# Altium schematic symbol library Molex FFC - FPC Connectors (SMT).SchLib: 638 symbols (part 8 of 10)
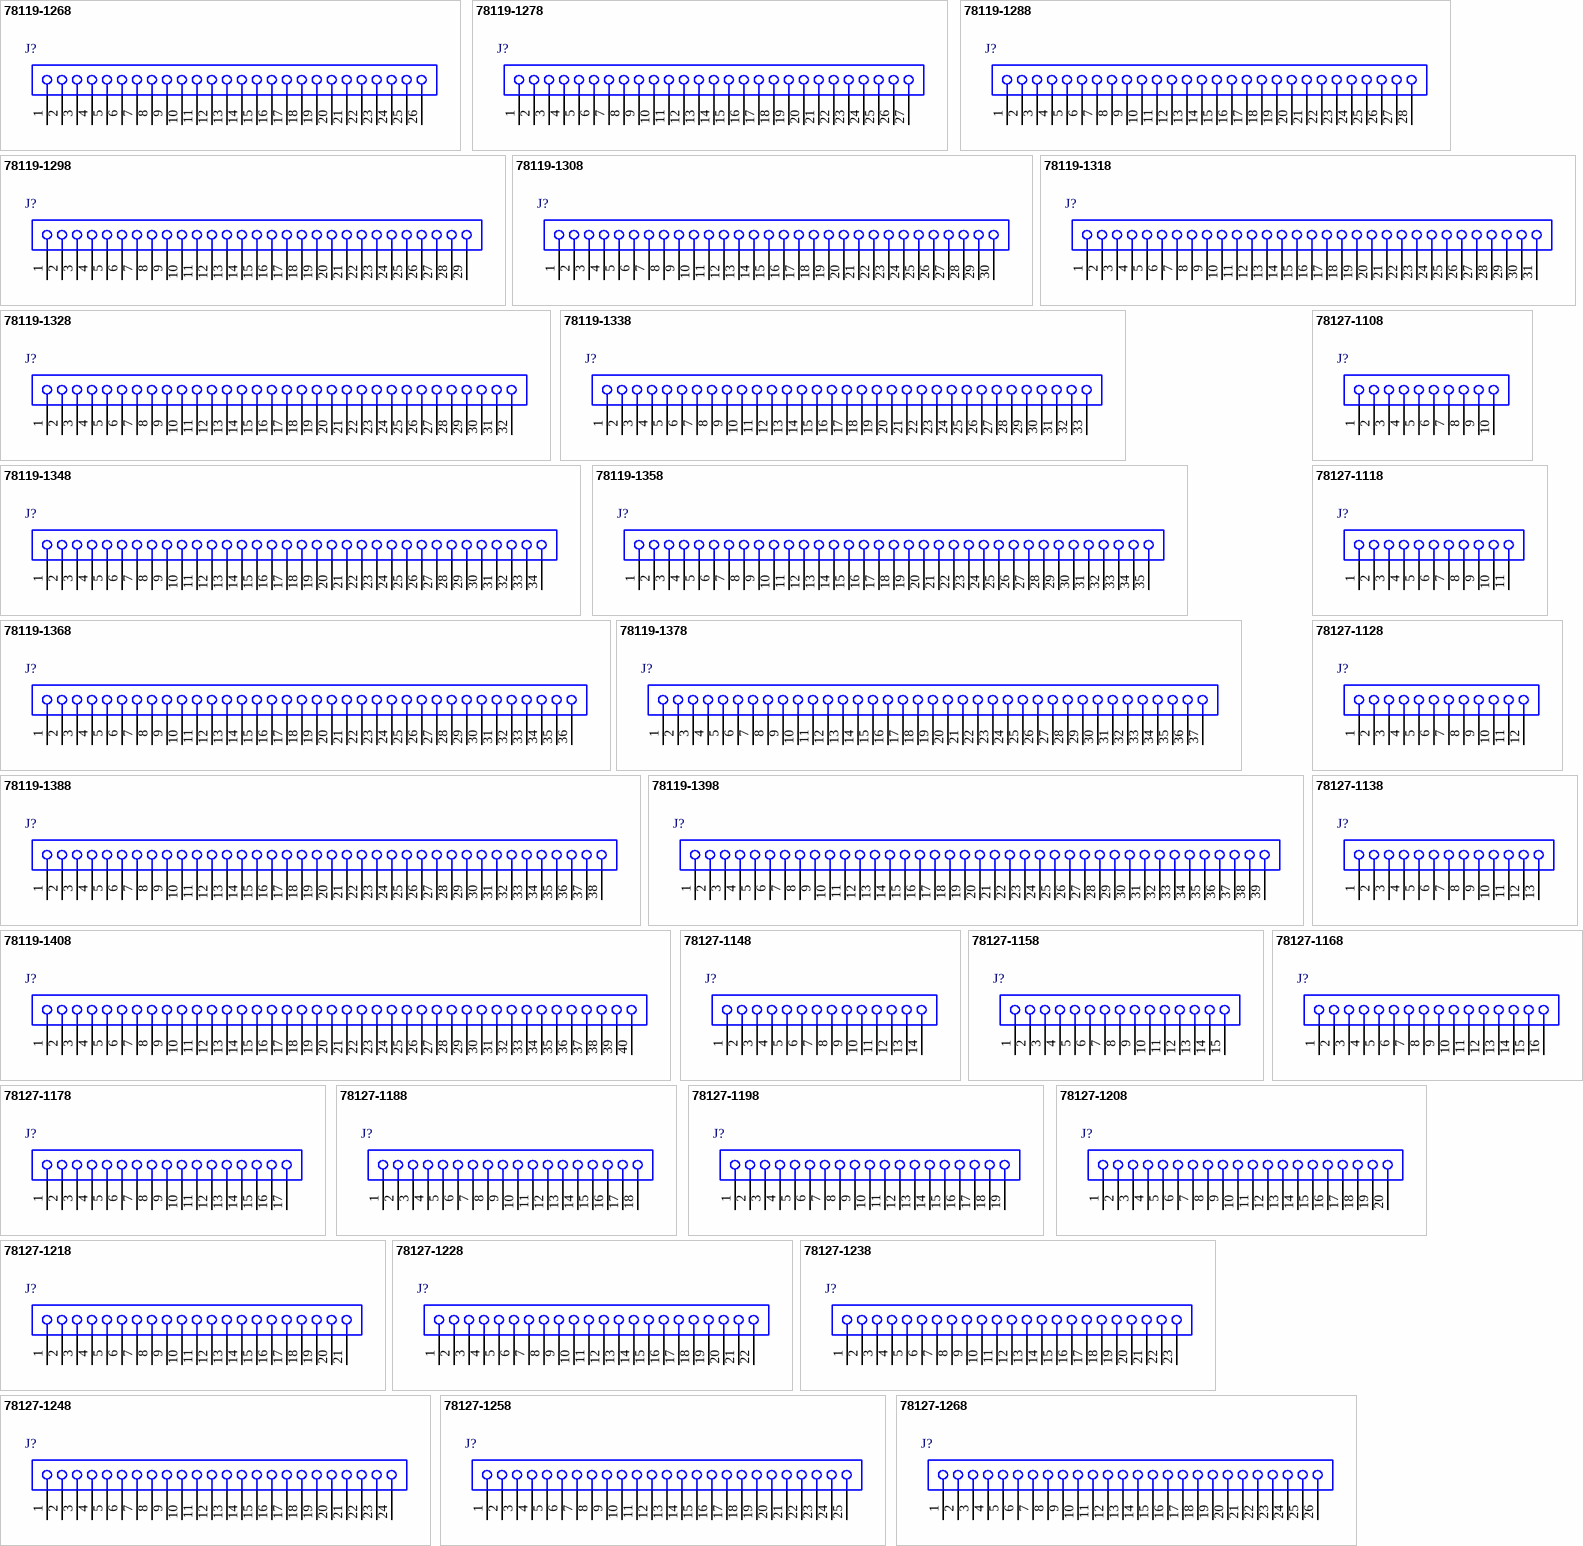
[diagram p28: symbols 78119-1268 to 78127-1268]

## 78119-1378
designator J?
0.5 mm Pitch Easy-On(TM) Type FPC Connector, 4.1 mm Mated Height, Vertical, Non-ZIF, SMT, 37 Circuits, -40 to 85 degC, ELV and RoHS Compliant, Tape and Reel; Manufacturer: Molex; PartNumber: 78119-1378; Circuits (Loaded): 37; Current (Max per Contact): 0.5A; Durability (mating cycles max): 20; Mated Height: 4.10mm; Material - Metal: Copper Alloy; Material - Plating Mating: Gold, Nickel; PCB Locator: No; PCB Retention: None; Pitch - Mating Interface: 0.50mm; Voltage (Max): 50V AC; PackageVersion: Rev. A4, 06/2013; PackageReference: 78119-1378; PackageDescription: 37-Lead FPC Connector, Pitch 0.5 mm; Contact Position: N/A; Entry Angle: Vertical; Number of Rows: 1; Orientation: Vertical; Packing: Tape and Reel; Pitch - Termination Interface: 0.50mm; Polarized to PCB: No; RoHS: TRUE; Stackable: No; Mounting Technology: Surface Mount; ComponentLink1Description: Manufacturer URL; ComponentLink1URL: http://www.molex.com/molex/index.jsp; ComponentLink2Description: Datasheet; ComponentLink2URL: http://www.molex.com/webdocs/datasheets/pdf/en-us/0781191378_FFC_FPC_CONNECTORS.pdf; ComponentLink3Description: Package Specification; ComponentLink3URL: http://www.molex.com/pdm_docs/sd/781191378_sd.pdf
footprint MOLX-78119-1378 (FPC Connector, 37-Leads, Vertical, Pitch 0.5 mm, Mated Height 4.1 mm, SMT)
pins: 1, 2, 3, 4, 5, 6, 7, 8, 9, 10, 11, 12, 13, 14, 15, 16, 17, 18, 19, 20, 21, 22, 23, 24, 25, 26, 27, 28, 29, 30, 31, 32, 33, 34, 35, 36, 37

## 78119-1388
designator J?
0.5 mm Pitch Easy-On(TM) Type FPC Connector, 4.1 mm Mated Height, Vertical, Non-ZIF, SMT, 38 Circuits, -40 to 85 degC, ELV and RoHS Compliant, Tape and Reel; Manufacturer: Molex; PartNumber: 78119-1388; Circuits (Loaded): 38; Current (Max per Contact): 0.5A; Durability (mating cycles max): 20; Mated Height: 4.10mm; Material - Metal: Copper Alloy; Material - Plating Mating: Gold, Nickel; PCB Locator: No; PCB Retention: None; Pitch - Mating Interface: 0.50mm; Voltage (Max): 50V AC; PackageVersion: Rev. A4, 06/2013; PackageReference: 78119-1388; PackageDescription: 38-Lead FPC Connector, Pitch 0.5 mm; Contact Position: N/A; Entry Angle: Vertical; Number of Rows: 1; Orientation: Vertical; Packing: Tape and Reel; Pitch - Termination Interface: 0.50mm; Polarized to PCB: No; RoHS: TRUE; Stackable: No; Mounting Technology: Surface Mount; ComponentLink1Description: Manufacturer URL; ComponentLink1URL: http://www.molex.com/molex/index.jsp; ComponentLink2Description: Datasheet; ComponentLink2URL: http://www.molex.com/webdocs/datasheets/pdf/en-us/0781191388_FFC_FPC_CONNECTORS.pdf; ComponentLink3Description: Package Specification; ComponentLink3URL: http://www.molex.com/pdm_docs/sd/781191388_sd.pdf
footprint MOLX-78119-1388 (FPC Connector, 38-Leads, Vertical, Pitch 0.5 mm, Mated Height 4.1 mm, SMT)
pins: 1, 2, 3, 4, 5, 6, 7, 8, 9, 10, 11, 12, 13, 14, 15, 16, 17, 18, 19, 20, 21, 22, 23, 24, 25, 26, 27, 28, 29, 30, 31, 32, 33, 34, 35, 36, 37, 38

## 78119-1398
designator J?
0.5 mm Pitch Easy-On(TM) Type FPC Connector, 4.1 mm Mated Height, Vertical, Non-ZIF, SMT, 39 Circuits, -40 to 85 degC, ELV and RoHS Compliant, Tape and Reel; Manufacturer: Molex; PartNumber: 78119-1398; Circuits (Loaded): 39; Current (Max per Contact): 0.5A; Durability (mating cycles max): 20; Mated Height: 4.10mm; Material - Metal: Copper Alloy; Material - Plating Mating: Gold, Nickel; PCB Locator: No; PCB Retention: None; Pitch - Mating Interface: 0.50mm; Voltage (Max): 50V AC; PackageVersion: Rev. A4, 06/2013; PackageReference: 78119-1398; PackageDescription: 39-Lead FPC Connector, Pitch 0.5 mm; Contact Position: N/A; Entry Angle: Vertical; Number of Rows: 1; Orientation: Vertical; Packing: Tape and Reel; Pitch - Termination Interface: 0.50mm; Polarized to PCB: No; RoHS: TRUE; Stackable: No; Mounting Technology: Surface Mount; ComponentLink1Description: Manufacturer URL; ComponentLink1URL: http://www.molex.com/molex/index.jsp; ComponentLink2Description: Datasheet; ComponentLink2URL: http://www.molex.com/webdocs/datasheets/pdf/en-us/0781191398_FFC_FPC_CONNECTORS.pdf; ComponentLink3Description: Package Specification; ComponentLink3URL: http://www.molex.com/pdm_docs/sd/781191398_sd.pdf
footprint MOLX-78119-1398 (FPC Connector, 39-Leads, Vertical, Pitch 0.5 mm, Mated Height 4.1 mm, SMT)
pins: 1, 2, 3, 4, 5, 6, 7, 8, 9, 10, 11, 12, 13, 14, 15, 16, 17, 18, 19, 20, 21, 22, 23, 24, 25, 26, 27, 28, 29, 30, 31, 32, 33, 34, 35, 36, 37, 38, 39

## 78119-1408
designator J?
0.5 mm Pitch Easy-On(TM) Type FPC Connector, 4.1 mm Mated Height, Vertical, Non-ZIF, SMT, 40 Circuits, -40 to 85 degC, ELV and RoHS Compliant, Tape and Reel; Manufacturer: Molex; PartNumber: 78119-1408; Circuits (Loaded): 40; Current (Max per Contact): 0.5A; Durability (mating cycles max): 20; Mated Height: 4.10mm; Material - Metal: Copper Alloy; Material - Plating Mating: Gold, Nickel; PCB Locator: No; PCB Retention: None; Pitch - Mating Interface: 0.50mm; Voltage (Max): 50V AC; PackageVersion: Rev. A4, 06/2013; PackageReference: 78119-1408; PackageDescription: 40-Lead FPC Connector, Pitch 0.5 mm; Contact Position: N/A; Entry Angle: Vertical; Number of Rows: 1; Orientation: Vertical; Packing: Tape and Reel; Pitch - Termination Interface: 0.50mm; Polarized to PCB: No; RoHS: TRUE; Stackable: No; Mounting Technology: Surface Mount; ComponentLink1Description: Manufacturer URL; ComponentLink1URL: http://www.molex.com/molex/index.jsp; ComponentLink2Description: Datasheet; ComponentLink2URL: http://www.molex.com/webdocs/datasheets/pdf/en-us/0781191408_FFC_FPC_CONNECTORS.pdf; ComponentLink3Description: Package Specification; ComponentLink3URL: http://www.molex.com/pdm_docs/sd/781191408_sd.pdf
footprint MOLX-78119-1408 (FPC Connector, 40-Leads, Vertical, Pitch 0.5 mm, Mated Height 4.1 mm, SMT)
pins: 1, 2, 3, 4, 5, 6, 7, 8, 9, 10, 11, 12, 13, 14, 15, 16, 17, 18, 19, 20, 21, 22, 23, 24, 25, 26, 27, 28, 29, 30, 31, 32, 33, 34, 35, 36, 37, 38, 39, 40

## 78127-1108
designator J?
0.5 mm Pitch Easy-On(TM) Type FPC Connector, 4.1 mm Mated Height, Vertical, Non-ZIF, SMT, 10 Circuits, -40 to 85 degC, ELV and RoHS Compliant, Tape and Reel; Manufacturer: Molex; PartNumber: 78127-1108; Circuits (Loaded): 10; Current (Max per Contact): 0.5A; Durability (mating cycles max): 20; Mated Height: 4.10mm; Material - Metal: Copper Alloy; Material - Plating Mating: Gold, Nickel; PCB Locator: No; PCB Retention: None; Pitch - Mating Interface: 0.50mm; Voltage (Max): 50V AC; PackageVersion: Rev. B, 12/2012; PackageReference: 78127-1108; PackageDescription: 10-Lead FPC Connector, Pitch 0.5 mm; Circuits (maximum): 10; Contact Position: N/A; Entry Angle: Vertical; Number of Rows: 1; Orientation: Vertical; Packing: Tape and Reel; Pitch - Termination Interface: 0.50mm; Polarized to PCB: No; RoHS: TRUE; Stackable: No; Mounting Technology: Surface Mount; ComponentLink1Description: Manufacturer URL; ComponentLink1URL: http://www.molex.com/molex/index.jsp; ComponentLink2Description: Datasheet; ComponentLink2URL: http://www.molex.com/webdocs/datasheets/pdf/en-us/0781271108_FFC_FPC_CONNECTORS.pdf; ComponentLink3Description: Package Specification; ComponentLink3URL: http://www.molex.com/pdm_docs/sd/781271108_sd.pdf
footprint MOLX-78127-1108 (FPC Connector, 10-Leads, Vertical, Pitch 0.5 mm, Mated Height 4.1 mm, SMT)
pins: 1, 2, 3, 4, 5, 6, 7, 8, 9, 10

## 78127-1118
designator J?
0.5 mm Pitch Easy-On(TM) Type FPC Connector, 4.1 mm Mated Height, Vertical, Non-ZIF, SMT, 11 Circuits, -40 to 85 degC, ELV and RoHS Compliant, Tape and Reel; Manufacturer: Molex; PartNumber: 78127-1118; Circuits (Loaded): 11; Current (Max per Contact): 0.5A; Durability (mating cycles max): 20; Mated Height: 4.10mm; Material - Metal: Copper Alloy; Material - Plating Mating: Gold, Nickel; PCB Locator: No; PCB Retention: None; Pitch - Mating Interface: 0.50mm; Voltage (Max): 50V AC; PackageVersion: Rev. B, 12/2012; PackageReference: 78127-1118; PackageDescription: 11-Lead FPC Connector, Pitch 0.5 mm; Circuits (maximum): 11; Contact Position: N/A; Entry Angle: Vertical; Number of Rows: 1; Orientation: Vertical; Packing: Tape and Reel; Pitch - Termination Interface: 0.50mm; Polarized to PCB: No; RoHS: TRUE; Stackable: No; Mounting Technology: Surface Mount; ComponentLink1Description: Manufacturer URL; ComponentLink1URL: http://www.molex.com/molex/index.jsp; ComponentLink2Description: Datasheet; ComponentLink2URL: http://www.molex.com/webdocs/datasheets/pdf/en-us/0781271118_FFC_FPC_CONNECTORS.pdf; ComponentLink3Description: Package Specification; ComponentLink3URL: http://www.molex.com/pdm_docs/sd/781271118_sd.pdf
footprint MOLX-78127-1118 (FPC Connector, 11-Leads, Vertical, Pitch 0.5 mm, Mated Height 4.1 mm, SMT)
pins: 1, 2, 3, 4, 5, 6, 7, 8, 9, 10, 11

## 78127-1128
designator J?
0.5 mm Pitch Easy-On(TM) Type FPC Connector, 4.1 mm Mated Height, Vertical, Non-ZIF, SMT, 12 Circuits, -40 to 85 degC, ELV and RoHS Compliant, Tape and Reel; Manufacturer: Molex; PartNumber: 78127-1128; Circuits (Loaded): 12; Current (Max per Contact): 0.5A; Durability (mating cycles max): 20; Mated Height: 4.10mm; Material - Metal: Copper Alloy; Material - Plating Mating: Gold, Nickel; PCB Locator: No; PCB Retention: None; Pitch - Mating Interface: 0.50mm; Voltage (Max): 50V AC; PackageVersion: Rev. B, 12/2012; PackageReference: 78127-1128; PackageDescription: 12-Lead FPC Connector, Pitch 0.5 mm; Circuits (maximum): 12; Contact Position: N/A; Entry Angle: Vertical; Number of Rows: 1; Orientation: Vertical; Packing: Tape and Reel; Pitch - Termination Interface: 0.50mm; Polarized to PCB: No; RoHS: TRUE; Stackable: No; Mounting Technology: Surface Mount; ComponentLink1Description: Manufacturer URL; ComponentLink1URL: http://www.molex.com/molex/index.jsp; ComponentLink2Description: Datasheet; ComponentLink2URL: http://www.molex.com/webdocs/datasheets/pdf/en-us/0781271128_FFC_FPC_CONNECTORS.pdf; ComponentLink3Description: Package Specification; ComponentLink3URL: http://www.molex.com/pdm_docs/sd/781271128_sd.pdf
footprint MOLX-78127-1128 (FPC Connector, 12-Leads, Vertical, Pitch 0.5 mm, Mated Height 4.1 mm, SMT)
pins: 1, 2, 3, 4, 5, 6, 7, 8, 9, 10, 11, 12

## 78127-1138
designator J?
0.5 mm Pitch Easy-On(TM) Type FPC Connector, 4.1 mm Mated Height, Vertical, Non-ZIF, SMT, 13 Circuits, -40 to 85 degC, ELV and RoHS Compliant, Tape and Reel; Manufacturer: Molex; PartNumber: 78127-1138; Circuits (Loaded): 13; Current (Max per Contact): 0.5A; Durability (mating cycles max): 20; Mated Height: 4.10mm; Material - Metal: Copper Alloy; Material - Plating Mating: Gold, Nickel; PCB Locator: No; PCB Retention: None; Pitch - Mating Interface: 0.50mm; Voltage (Max): 50V AC; PackageVersion: Rev. B, 12/2012; PackageReference: 78127-1138; PackageDescription: 13-Lead FPC Connector, Pitch 0.5 mm; Circuits (maximum): 13; Contact Position: N/A; Entry Angle: Vertical; Number of Rows: 1; Orientation: Vertical; Packing: Tape and Reel; Pitch - Termination Interface: 0.50mm; Polarized to PCB: No; RoHS: TRUE; Stackable: No; Mounting Technology: Surface Mount; ComponentLink1Description: Manufacturer URL; ComponentLink1URL: http://www.molex.com/molex/index.jsp; ComponentLink2Description: Datasheet; ComponentLink2URL: http://www.molex.com/webdocs/datasheets/pdf/en-us/0781271138_FFC_FPC_CONNECTORS.pdf; ComponentLink3Description: Package Specification; ComponentLink3URL: http://www.molex.com/pdm_docs/sd/781271138_sd.pdf
footprint MOLX-78127-1138 (FPC Connector, 13-Leads, Vertical, Pitch 0.5 mm, Mated Height 4.1 mm, SMT)
pins: 1, 2, 3, 4, 5, 6, 7, 8, 9, 10, 11, 12, 13

## 78127-1148
designator J?
0.5 mm Pitch Easy-On(TM) Type FPC Connector, 4.1 mm Mated Height, Vertical, Non-ZIF, SMT, 14 Circuits, -40 to 85 degC, ELV and RoHS Compliant, Tape and Reel; Manufacturer: Molex; PartNumber: 78127-1148; Circuits (Loaded): 14; Current (Max per Contact): 0.5A; Durability (mating cycles max): 20; Mated Height: 4.10mm; Material - Metal: Copper Alloy; Material - Plating Mating: Gold, Nickel; PCB Locator: No; PCB Retention: None; Pitch - Mating Interface: 0.50mm; Voltage (Max): 50V AC; PackageVersion: Rev. B, 12/2012; PackageReference: 78127-1148; PackageDescription: 14-Lead FPC Connector, Pitch 0.5 mm; Circuits (maximum): 14; Contact Position: N/A; Entry Angle: Vertical; Number of Rows: 1; Orientation: Vertical; Packing: Tape and Reel; Pitch - Termination Interface: 0.50mm; Polarized to PCB: No; RoHS: TRUE; Stackable: No; Mounting Technology: Surface Mount; ComponentLink1Description: Manufacturer URL; ComponentLink1URL: http://www.molex.com/molex/index.jsp; ComponentLink2Description: Datasheet; ComponentLink2URL: http://www.molex.com/webdocs/datasheets/pdf/en-us/0781271148_FFC_FPC_CONNECTORS.pdf; ComponentLink3Description: Package Specification; ComponentLink3URL: http://www.molex.com/pdm_docs/sd/781271148_sd.pdf
footprint MOLX-78127-1148 (FPC Connector, 14-Leads, Vertical, Pitch 0.5 mm, Mated Height 4.1 mm, SMT)
pins: 1, 2, 3, 4, 5, 6, 7, 8, 9, 10, 11, 12, 13, 14

## 78127-1158
designator J?
0.5 mm Pitch Easy-On(TM) Type FPC Connector, 4.1 mm Mated Height, Vertical, Non-ZIF, SMT, 15 Circuits, -40 to 85 degC, ELV and RoHS Compliant, Tape and Reel; Manufacturer: Molex; PartNumber: 78127-1158; Circuits (Loaded): 15; Current (Max per Contact): 0.5A; Durability (mating cycles max): 20; Mated Height: 4.10mm; Material - Metal: Copper Alloy; Material - Plating Mating: Gold, Nickel; PCB Locator: No; PCB Retention: None; Pitch - Mating Interface: 0.50mm; Voltage (Max): 50V AC; PackageVersion: Rev. B, 12/2012; PackageReference: 78127-1158; PackageDescription: 15-Lead FPC Connector, Pitch 0.5 mm; Circuits (maximum): 15; Contact Position: N/A; Entry Angle: Vertical; Number of Rows: 1; Orientation: Vertical; Packing: Tape and Reel; Pitch - Termination Interface: 0.50mm; Polarized to PCB: No; RoHS: TRUE; Stackable: No; Mounting Technology: Surface Mount; ComponentLink1Description: Manufacturer URL; ComponentLink1URL: http://www.molex.com/molex/index.jsp; ComponentLink2Description: Datasheet; ComponentLink2URL: http://www.molex.com/webdocs/datasheets/pdf/en-us/0781271158_FFC_FPC_CONNECTORS.pdf; ComponentLink3Description: Package Specification; ComponentLink3URL: http://www.molex.com/pdm_docs/sd/781271158_sd.pdf
footprint MOLX-78127-1158 (FPC Connector, 15-Leads, Vertical, Pitch 0.5 mm, Mated Height 4.1 mm, SMT)
pins: 1, 2, 3, 4, 5, 6, 7, 8, 9, 10, 11, 12, 13, 14, 15

## 78127-1168
designator J?
0.5 mm Pitch Easy-On(TM) Type FPC Connector, 4.1 mm Mated Height, Vertical, Non-ZIF, SMT, 16 Circuits, -40 to 85 degC, ELV and RoHS Compliant, Tape and Reel; Manufacturer: Molex; PartNumber: 78127-1168; Circuits (Loaded): 16; Current (Max per Contact): 0.5A; Durability (mating cycles max): 20; Mated Height: 4.10mm; Material - Metal: Copper Alloy; Material - Plating Mating: Gold, Nickel; PCB Locator: No; PCB Retention: None; Pitch - Mating Interface: 0.50mm; Voltage (Max): 50V AC; PackageVersion: Rev. B, 12/2012; PackageReference: 78127-1168; PackageDescription: 16-Lead FPC Connector, Pitch 0.5 mm; Circuits (maximum): 16; Contact Position: N/A; Entry Angle: Vertical; Number of Rows: 1; Orientation: Vertical; Packing: Tape and Reel; Pitch - Termination Interface: 0.50mm; Polarized to PCB: No; RoHS: TRUE; Stackable: No; Mounting Technology: Surface Mount; ComponentLink1Description: Manufacturer URL; ComponentLink1URL: http://www.molex.com/molex/index.jsp; ComponentLink2Description: Datasheet; ComponentLink2URL: http://www.molex.com/webdocs/datasheets/pdf/en-us/0781271168_FFC_FPC_CONNECTORS.pdf; ComponentLink3Description: Package Specification; ComponentLink3URL: http://www.molex.com/pdm_docs/sd/781271168_sd.pdf
footprint MOLX-78127-1168 (FPC Connector, 16-Leads, Vertical, Pitch 0.5 mm, Mated Height 4.1 mm, SMT)
pins: 1, 2, 3, 4, 5, 6, 7, 8, 9, 10, 11, 12, 13, 14, 15, 16

## 78127-1178
designator J?
0.5 mm Pitch Easy-On(TM) Type FPC Connector, 4.1 mm Mated Height, Vertical, Non-ZIF, SMT, 17 Circuits, -40 to 85 degC, ELV and RoHS Compliant, Tape and Reel; Manufacturer: Molex; PartNumber: 78127-1178; Circuits (Loaded): 17; Current (Max per Contact): 0.5A; Durability (mating cycles max): 20; Mated Height: 4.10mm; Material - Metal: Copper Alloy; Material - Plating Mating: Gold, Nickel; PCB Locator: No; PCB Retention: None; Pitch - Mating Interface: 0.50mm; Voltage (Max): 50V AC; PackageVersion: Rev. B, 12/2012; PackageReference: 78127-1178; PackageDescription: 17-Lead FPC Connector, Pitch 0.5 mm; Circuits (maximum): 17; Contact Position: N/A; Entry Angle: Vertical; Number of Rows: 1; Orientation: Vertical; Packing: Tape and Reel; Pitch - Termination Interface: 0.50mm; Polarized to PCB: No; RoHS: TRUE; Stackable: No; Mounting Technology: Surface Mount; ComponentLink1Description: Manufacturer URL; ComponentLink1URL: http://www.molex.com/molex/index.jsp; ComponentLink2Description: Datasheet; ComponentLink2URL: http://www.molex.com/webdocs/datasheets/pdf/en-us/0781271178_FFC_FPC_CONNECTORS.pdf; ComponentLink3Description: Package Specification; ComponentLink3URL: http://www.molex.com/pdm_docs/sd/781271178_sd.pdf
footprint MOLX-78127-1178 (FPC Connector, 17-Leads, Vertical, Pitch 0.5 mm, Mated Height 4.1 mm, SMT)
pins: 1, 2, 3, 4, 5, 6, 7, 8, 9, 10, 11, 12, 13, 14, 15, 16, 17

## 78127-1188
designator J?
0.5 mm Pitch Easy-On(TM) Type FPC Connector, 4.1 mm Mated Height, Vertical, Non-ZIF, SMT, 18 Circuits, -40 to 85 degC, ELV and RoHS Compliant, Tape and Reel; Manufacturer: Molex; PartNumber: 78127-1188; Circuits (Loaded): 18; Current (Max per Contact): 0.5A; Durability (mating cycles max): 20; Mated Height: 4.10mm; Material - Metal: Copper Alloy; Material - Plating Mating: Gold, Nickel; PCB Locator: No; PCB Retention: None; Pitch - Mating Interface: 0.50mm; Voltage (Max): 50V AC; PackageVersion: Rev. B, 12/2012; PackageReference: 78127-1188; PackageDescription: 18-Lead FPC Connector, Pitch 0.5 mm; Circuits (maximum): 18; Contact Position: N/A; Entry Angle: Vertical; Number of Rows: 1; Orientation: Vertical; Packing: Tape and Reel; Pitch - Termination Interface: 0.50mm; Polarized to PCB: No; RoHS: TRUE; Stackable: No; Mounting Technology: Surface Mount; ComponentLink1Description: Manufacturer URL; ComponentLink1URL: http://www.molex.com/molex/index.jsp; ComponentLink2Description: Datasheet; ComponentLink2URL: http://www.molex.com/webdocs/datasheets/pdf/en-us/0781271188_FFC_FPC_CONNECTORS.pdf; ComponentLink3Description: Package Specification; ComponentLink3URL: http://www.molex.com/pdm_docs/sd/781271188_sd.pdf
footprint MOLX-78127-1188 (FPC Connector, 18-Leads, Vertical, Pitch 0.5 mm, Mated Height 4.1 mm, SMT)
pins: 1, 2, 3, 4, 5, 6, 7, 8, 9, 10, 11, 12, 13, 14, 15, 16, 17, 18

## 78127-1198
designator J?
0.5 mm Pitch Easy-On(TM) Type FPC Connector, 4.1 mm Mated Height, Vertical, Non-ZIF, SMT, 19 Circuits, -40 to 85 degC, ELV and RoHS Compliant, Tape and Reel; Manufacturer: Molex; PartNumber: 78127-1198; Circuits (Loaded): 19; Current (Max per Contact): 0.5A; Durability (mating cycles max): 20; Mated Height: 4.10mm; Material - Metal: Copper Alloy; Material - Plating Mating: Gold, Nickel; PCB Locator: No; PCB Retention: None; Pitch - Mating Interface: 0.50mm; Voltage (Max): 50V AC; PackageVersion: Rev. B, 12/2012; PackageReference: 78127-1198; PackageDescription: 19-Lead FPC Connector, Pitch 0.5 mm; Circuits (maximum): 19; Contact Position: N/A; Entry Angle: Vertical; Number of Rows: 1; Orientation: Vertical; Packing: Tape and Reel; Pitch - Termination Interface: 0.50mm; Polarized to PCB: No; RoHS: TRUE; Stackable: No; Mounting Technology: Surface Mount; ComponentLink1Description: Manufacturer URL; ComponentLink1URL: http://www.molex.com/molex/index.jsp; ComponentLink2Description: Datasheet; ComponentLink2URL: http://www.molex.com/webdocs/datasheets/pdf/en-us/0781271198_FFC_FPC_CONNECTORS.pdf; ComponentLink3Description: Package Specification; ComponentLink3URL: http://www.molex.com/pdm_docs/sd/781271198_sd.pdf
footprint MOLX-78127-1198 (FPC Connector, 19-Leads, Vertical, Pitch 0.5 mm, Mated Height 4.1 mm, SMT)
pins: 1, 2, 3, 4, 5, 6, 7, 8, 9, 10, 11, 12, 13, 14, 15, 16, 17, 18, 19

## 78127-1208
designator J?
0.5 mm Pitch Easy-On(TM) Type FPC Connector, 4.1 mm Mated Height, Vertical, Non-ZIF, SMT, 20 Circuits, -40 to 85 degC, ELV and RoHS Compliant, Tape and Reel; Manufacturer: Molex; PartNumber: 78127-1208; Circuits (Loaded): 20; Current (Max per Contact): 0.5A; Mated Height: 4.10mm; Material - Metal: Copper Alloy; Material - Plating Mating: Gold, Nickel; PCB Locator: No; PCB Retention: None; Pitch - Mating Interface: 0.50mm; Voltage (Max): 50V AC; PackageVersion: Rev. B, 12/2012; PackageReference: 78127-1208; PackageDescription: 20-Lead FPC Connector, Pitch 0.5 mm; Circuits (maximum): 20; Contact Position: N/A; Durability (mating cycles max): 20; Entry Angle: Vertical; Number of Rows: 1; Orientation: Vertical; Packing: Tape and Reel; Pitch - Termination Interface: 0.50mm; Polarized to PCB: No; RoHS: TRUE; Stackable: No; Mounting Technology: Surface Mount; ComponentLink1Description: Manufacturer URL; ComponentLink1URL: http://www.molex.com/molex/index.jsp; ComponentLink2Description: Datasheet; ComponentLink2URL: http://www.molex.com/webdocs/datasheets/pdf/en-us/0781271208_FFC_FPC_CONNECTORS.pdf; ComponentLink3Description: Package Specification; ComponentLink3URL: http://www.molex.com/pdm_docs/sd/781271208_sd.pdf
footprint MOLX-78127-1208 (FPC Connector, 20-Leads, Vertical, Pitch 0.5 mm, Mated Height 4.1 mm, SMT)
pins: 1, 2, 3, 4, 5, 6, 7, 8, 9, 10, 11, 12, 13, 14, 15, 16, 17, 18, 19, 20

## 78127-1218
designator J?
0.5 mm Pitch Easy-On(TM) Type FPC Connector, 4.1 mm Mated Height, Vertical, Non-ZIF, SMT, 21 Circuits, -40 to 85 degC, ELV and RoHS Compliant, Tape and Reel; Manufacturer: Molex; PartNumber: 78127-1218; Circuits (Loaded): 21; Current (Max per Contact): 0.5A; Durability (mating cycles max): 20; Mated Height: 4.10mm; Material - Metal: Copper Alloy; Material - Plating Mating: Gold, Nickel; PCB Locator: No; PCB Retention: None; Pitch - Mating Interface: 0.50mm; Voltage (Max): 50V AC; PackageVersion: Rev. B, 12/2012; PackageReference: 78127-1218; PackageDescription: 21-Lead FPC Connector, Pitch 0.5 mm; Circuits (maximum): 21; Contact Position: N/A; Entry Angle: Vertical; Number of Rows: 1; Orientation: Vertical; Packing: Tape and Reel; Pitch - Termination Interface: 0.50mm; Polarized to PCB: No; RoHS: TRUE; Stackable: No; Mounting Technology: Surface Mount; ComponentLink1Description: Manufacturer URL; ComponentLink1URL: http://www.molex.com/molex/index.jsp; ComponentLink2Description: Datasheet; ComponentLink2URL: http://www.molex.com/webdocs/datasheets/pdf/en-us/0781271218_FFC_FPC_CONNECTORS.pdf; ComponentLink3Description: Package Specification; ComponentLink3URL: http://www.molex.com/pdm_docs/sd/781271218_sd.pdf
footprint MOLX-78127-1218 (FPC Connector, 21-Leads, Vertical, Pitch 0.5 mm, Mated Height 4.1 mm, SMT)
pins: 1, 2, 3, 4, 5, 6, 7, 8, 9, 10, 11, 12, 13, 14, 15, 16, 17, 18, 19, 20, 21

## 78127-1228
designator J?
0.5 mm Pitch Easy-On(TM) Type FPC Connector, 4.1 mm Mated Height, Vertical, Non-ZIF, SMT, 22 Circuits, -40 to 85 degC, ELV and RoHS Compliant, Tape and Reel; Manufacturer: Molex; PartNumber: 78127-1228; Circuits (Loaded): 22; Current (Max per Contact): 0.5A; Durability (mating cycles max): 20; Mated Height: 4.10mm; Material - Metal: Copper Alloy; Material - Plating Mating: Gold, Nickel; PCB Locator: No; PCB Retention: None; Pitch - Mating Interface: 0.50mm; Voltage (Max): 50V AC; PackageVersion: Rev. B, 12/2012; PackageReference: 78127-1228; PackageDescription: 22-Lead FPC Connector, Pitch 0.5 mm; Circuits (maximum): 22; Contact Position: N/A; Entry Angle: Vertical; Number of Rows: 1; Orientation: Vertical; Packing: Tape and Reel; Pitch - Termination Interface: 0.50mm; Polarized to PCB: No; RoHS: TRUE; Stackable: No; Mounting Technology: Surface Mount; ComponentLink1Description: Manufacturer URL; ComponentLink1URL: http://www.molex.com/molex/index.jsp; ComponentLink2Description: Datasheet; ComponentLink2URL: http://www.molex.com/webdocs/datasheets/pdf/en-us/0781271228_FFC_FPC_CONNECTORS.pdf; ComponentLink3Description: Package Specification; ComponentLink3URL: http://www.molex.com/pdm_docs/sd/781271228_sd.pdf
footprint MOLX-78127-1228 (FPC Connector, 22-Leads, Vertical, Pitch 0.5 mm, Mated Height 4.1 mm, SMT)
pins: 1, 2, 3, 4, 5, 6, 7, 8, 9, 10, 11, 12, 13, 14, 15, 16, 17, 18, 19, 20, 21, 22
